# Altium footprint library uc_dev.PcbLib: 264 footprints (part 17 of 17)
Each footprint in its own frame and in the unit in brackets; x right, y up, seen from the top. Pads: shape width x height; smd on the part's side, far side on the other; paste and mask are expansions set on the pad; w line width, h text height; cw(c..) or ccw(c..) is an arc to the next point about the centre after c.
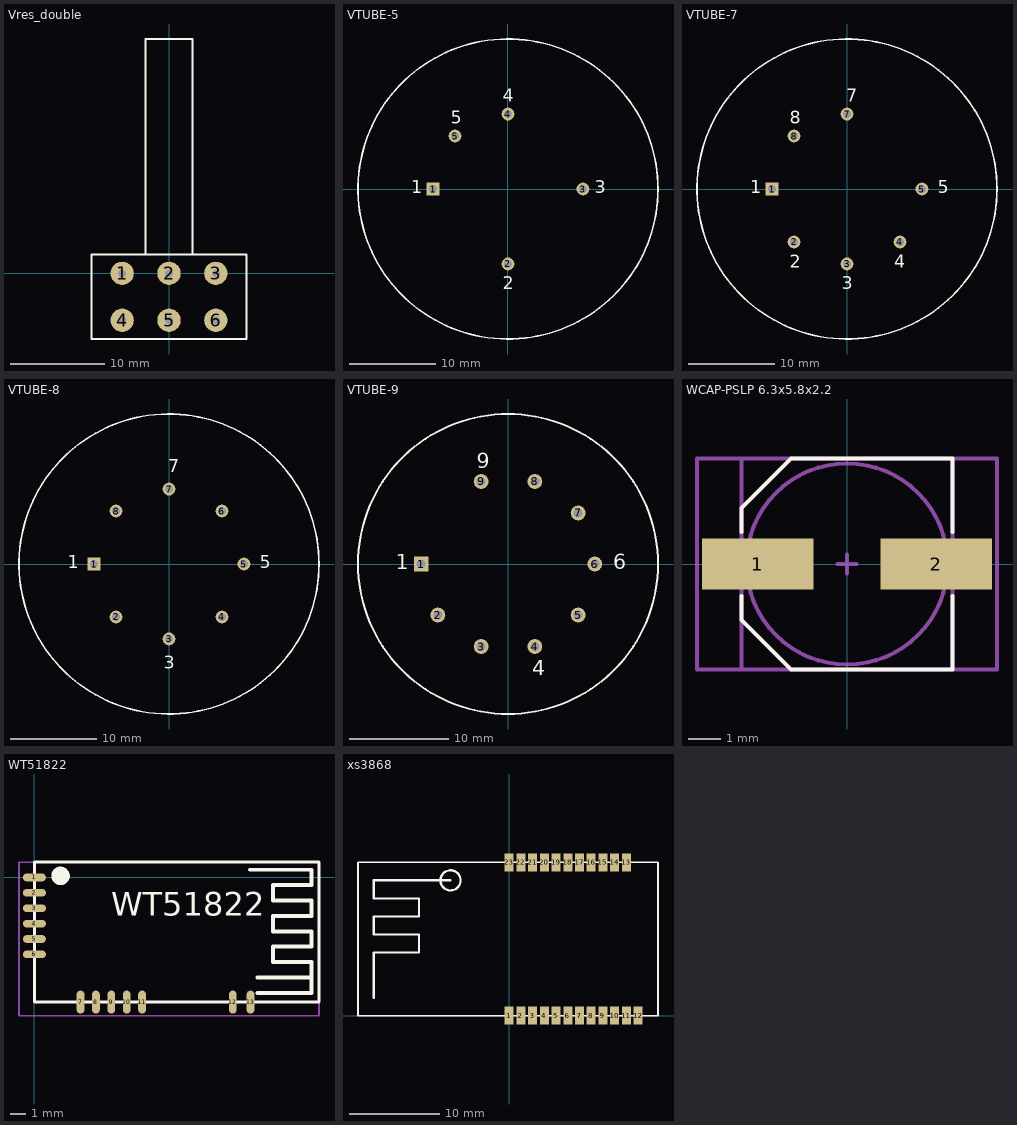
[diagram p16: the footprints below, top view; thin cyan lines are the x and y axes]

## Vres_double [mm] "Axial Device, Thru-Hole; 2 Leads; 0.3 in Pin Spacing"
height 1.524
pads (6):
  round 2.5 hole 0.85: 1(-5,0) 2(0,0) 3(5,0) 4(-5,-5) 5(0,-5) 6(5,-5)
Top Overlay:
  lines w0.2: -2.5,2 -2.5,25 2.5,25 2.5,2 ; -8.25,-7 -8.25,2 8.25,2 8.25,-7 -8.25,-7

## VTUBE-5 [mm] "Vacuum Tube; 5 Leads"
pads (5):
  rect 1.5x1.5 hole 0.9: 1(-8.725,0)
  round 1.5 hole 0.9: 2(0,-8.725) 3(8.725,0) 4(0,8.725) 5(-6.17,6.17)
Top Overlay:
  circle w0.2: c0,0 r17.462
  text "1" at -11.265,-0.508 h1.5
  text "2" at -0.597,-11.684 h1.5
  text "4" at -0.597,10.16 h1.5
  text "5" at -6.693,7.62 h1.5
  text "3" at 10.071,-0.508 h1.5

## VTUBE-7 [mm] "Vacuum Tube; 7 Leads"
height 108
pads (7):
  rect 1.5x1.5 hole 0.9: 1(-8.725,0)
  round 1.5 hole 0.9: 2(-6.17,-6.17) 3(0,-8.725) 4(6.17,-6.17) 5(8.725,0) 7(0,8.725) 8(-6.17,6.17)
Top Overlay:
  circle w0.2: c0,0 r17.462
  text "1" at -11.265,-0.508 h1.5
  text "2" at -6.693,-9.144 h1.5
  text "3" at -0.597,-11.684 h1.5
  text "4" at 5.499,-9.144 h1.5
  text "5" at 10.579,-0.508 h1.5
  text "7" at -0.089,10.16 h1.5
  text "8" at -6.693,7.62 h1.5

## VTUBE-8 [mm] "Vacuum Tube; 8 Leads"
height 108
pads (8):
  rect 1.5x1.5 hole 0.9: 1(-8.725,0)
  round 1.5 hole 0.9: 2(-6.17,-6.17) 3(0,-8.725) 4(6.17,-6.17) 5(8.725,0) 6(6.17,6.17) 7(0,8.725) 8(-6.17,6.17)
Top Overlay:
  circle w0.2: c0,0 r17.462
  text "1" at -11.773,-0.508 h1.5
  text "3" at -0.597,-12.192 h1.5
  text "5" at 10.579,-0.508 h1.5
  text "7" at -0.089,10.668 h1.5

## VTUBE-9 [mm] "Vacuum Tube; 9 Leads"
height 66.7
pads (9):
  rect 1.5x1.5 hole 0.9: 1(-8.725,0)
  round 1.5 hole 0.9: 2(-7.059,-5.128) 3(-2.696,-8.298) 4(2.696,-8.298) 5(7.059,-5.128) 6(8.725,0) 7(7.059,5.128) 8(2.696,8.298) 9(-2.696,8.298)
Top Overlay:
  circle w0.2: c0,0 r15.081
  text "1" at -11.265,-0.508 h1.5
  text "9" at -3.137,9.652 h1.5
  text "6" at 10.579,-0.508 h1.5
  text "4" at 2.451,-11.176 h1.5

## WCAP-PSLP 6.3x5.8x2.2 [mm] "Polarized capacitors, Aluminum Polymer Capacitors, 2-Leads, Body 6.3x5.8x2.2"
height 5.8
pads (2):
  rect 3.5x1.6 smd: 1(-2.8,0) 2(2.8,0)
Top Overlay:
  lines w0.127: -3.3,-1 -3.3,-1.75 -1.75,-3.3 3.3,-3.3 3.3,-1 ; -3.3,1 -3.3,1.75 -1.75,3.3 3.3,3.3 3.3,1
Mechanical 13:
  circle w0.127: c0,0 r3.15
  lines w0.127: -3.3,-3.3 -3.3,3.3 3.3,3.3 3.3,-3.3 -3.3,-3.3
Mechanical 15:
  lines w0.127: -0.3,0 0.3,0 ; 0,-0.3 0,0.3 ; -4.699,-3.302 -4.699,3.302 4.699,3.302 4.699,-3.302 -4.699,-3.302
3D body "6.3x5.8x2.2.stp": height 5.75, standoff -0.05, extent -3.65,-3.3 3.65,3.3

## WT51822 [mm]
height 2
pads (13):
  oval 1.5x0.5 smd: 1(0,0) 2(0,-1) 3(0,-2) 4(0,-3) 5(0,-4) 6(0,-5)
  oval 0.5x1.5 smd: 7(3,-8.1) 8(4,-8.1) 9(5,-8.1) 10(6,-8.1) 11(7,-8.1) 12(12.9,-8.1) 13(14.05,-8.1)
Top Overlay:
  circle w0.6: c1.7,0.1 r0.3
  lines w0.2: 0,-8.1 0,1 18.5,1 18.5,-8.1 0,-8.1
  lines w0.254: 14,0.5 18,0.5 18,-0.5 15.5,-0.5 15.5,-1.5 18,-1.5 18,-2.5 15.5,-2.5 15.5,-3.5 18,-3.5 18,-4.5 15.5,-4.5 15.5,-5.5 18,-5.5 18,-6.5 ; 14.5,-7.5 18,-7.5 18,-6.5 ; 14.5,-6.5 18,-6.5
  text "WT51822" at 5,-2.5 h1.52
Mechanical 13:
  lines w0.1: -1,-9 18.5,-9 18.5,1 -1,1 -1,-9
Mechanical 15:
  lines w0.1: -0.5,0 0.5,0 ; 0,-0.5 0,0.5

## xs3868 [mm] "Bluetoth module"
height 5.06
pads (23):
  rect 1x2 smd: 1(0,0) 3(2.6,0) 4(3.9,0) 5(5.2,0) 6(6.5,0) 7(7.8,0) 8(9.1,0) 9(10.4,0) 11(13,0) 12(14.3,0) 13(13,17) 14(11.7,17) 16(9.1,17) 17(7.8,17) 18(6.5,17) 19(5.2,17) 20(3.9,17) 21(2.6,17) 22(1.3,17)
  rect 1x2 smd paste+0: 2(1.3,0) 10(11.7,0) 15(10.4,17) 23(0,17)
Top Overlay:
  circle w0.254: c-6.5,15 r1.118
  lines w0.2: -16.75,0 16.5,0 16.5,17 -16.75,17 -16.75,0
  lines w0.254: -15,2 -15,7 -10,7 -10,9 -15,9 -15,11 -10,11 -10,13 -15,13 -15,15 -6.5,15